# Altium footprint library 20210518.PcbLib: 414 footprints (part 20 of 26)
Each footprint in its own frame and in the unit in brackets; x right, y up, seen from the top. Pads: shape width x height; smd on the part's side, far side on the other; paste and mask are expansions set on the pad; w line width, h text height; cw(c..) or ccw(c..) is an arc to the next point about the centre after c.
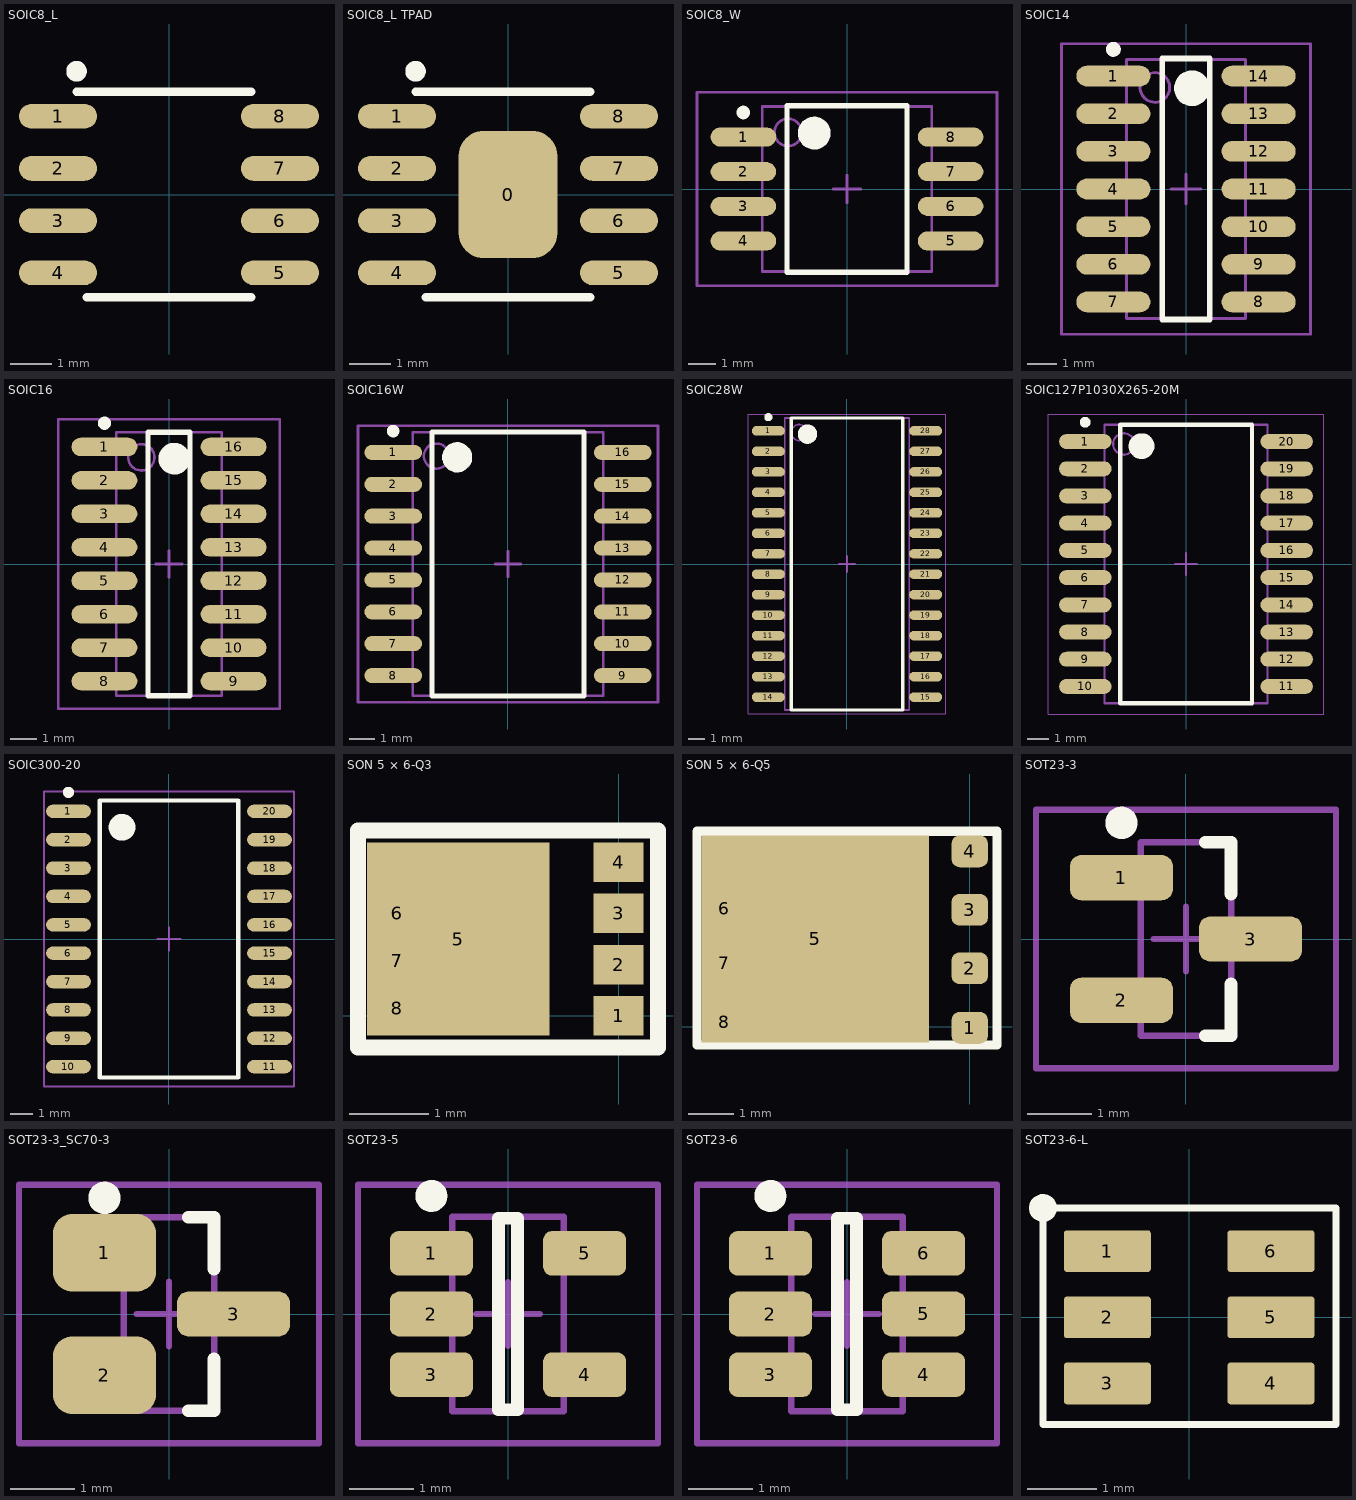
[diagram p19: the footprints below, top view; thin cyan lines are the x and y axes]

## SOIC8_L [mm] "SOIC, 8-Leads, Body 4.9x3.9mm, Pitch 1.27mm, IPC High Density"
height 1.75
pads (8):
  oval 1.9x0.6 smd: 1(-2.7,1.905) 2(-2.7,0.635) 3(-2.7,-0.635) 4(-2.7,-1.905) 5(2.7,-1.905) 6(2.7,-0.635) 7(2.7,0.635) 8(2.7,1.905)
Top Overlay:
  circle w0.25: c-2.25,3 r0.125
  lines w0.2: -2.25,2.5 2,2.5 ; -2,-2.5 2,-2.5
3D body: height 1.75, standoff 0, extent -3.006,-2.5 3.006,2.5

## SOIC8_L TPAD [mm] "SOIC, 8-Leads, Body 4.9x3.9mm, Pitch 1.27mm, IPC High Density"
height 1.75
pads (9):
  rrect50% 2.4x3.1 smd: 0(0,0)
  oval 1.9x0.6 smd: 1(-2.7,1.905) 2(-2.7,0.635) 3(-2.7,-0.635) 4(-2.7,-1.905) 5(2.7,-1.905) 6(2.7,-0.635) 7(2.7,0.635) 8(2.7,1.905)
Top Overlay:
  circle w0.25: c-2.25,3 r0.125
  lines w0.2: -2.25,2.5 2,2.5 ; -2,-2.5 2,-2.5
3D body: height 1.75, standoff 0, extent -3.006,-2.5 3.006,2.5

## SOIC8_W [mm] "SOIC, 8-Leads, Body 6,1x6,2mm (max), Pitch 1,27mm, IPC Low Density"
height 2.5
pads (8):
  oval 2.4x0.7 smd: 1(-3.8,1.905) 2(-3.8,0.635) 3(-3.8,-0.635) 4(-3.8,-1.905) 5(3.8,-1.905) 6(3.8,-0.635) 7(3.8,0.635) 8(3.8,1.905)
Top Overlay:
  circle w0.6: c-1.2,2.05 r0.3
  circle w0.25: c-3.8,2.805 r0.125
  lines w0.2: -2.2,-3.05 2.2,-3.05 2.2,3.05 -2.2,3.05 -2.2,-3.05
Mechanical 13:
  circle w0.1: c-2.16,2.075 r0.5
  lines w0.1: -3.11,-3.025 3.11,-3.025 3.11,3.025 -3.11,3.025 -3.11,-3.025
Mechanical 15:
  lines w0.1: -0.5,0 0.5,0 ; 0,-0.5 0,0.5 ; -5.5,-3.55 5.5,-3.55 5.5,3.55 -5.5,3.55 -5.5,-3.55
3D body: height 1.75, standoff 0, extent -3,-2.45 3,2.45

## SOIC14 [mm] "SOIC, 14-Leads, Body 8,8x4,0mm (max), Pitch 1,27mm, IPC Low Density"
height 1.75
pads (14):
  oval 2.5x0.7 smd: 1(-2.45,3.81) 2(-2.45,2.54) 3(-2.45,1.27) 4(-2.45,0) 5(-2.45,-1.27) 6(-2.45,-2.54) 7(-2.45,-3.81) 8(2.45,-3.81) 9(2.45,-2.54) 10(2.45,-1.27) 11(2.45,0) 12(2.45,1.27) 13(2.45,2.54) 14(2.45,3.81)
Top Overlay:
  circle w0.6: c0.2,3.4 r0.3
  circle w0.25: c-2.45,4.71 r0.125
  lines w0.2: -0.8,-4.4 0.8,-4.4 0.8,4.4 -0.8,4.4 -0.8,-4.4
Mechanical 13:
  circle w0.1: c-1.05,3.425 r0.5
  lines w0.1: -2,-4.375 2,-4.375 2,4.375 -2,4.375 -2,-4.375
Mechanical 15:
  lines w0.1: -0.5,0 0.5,0 ; 0,-0.5 0,0.5 ; -4.2,-4.9 4.2,-4.9 4.2,4.9 -4.2,4.9 -4.2,-4.9
3D body: height 1.75, standoff 0, extent -2.8,-4.23 3,4.3

## SOIC16 [mm] "SOIC, 16-Leads, Body 10,0x4,0mm (max), Pitch 1,27mm, IPC Low Density"
height 1.75
pads (16):
  oval 2.5x0.7 smd: 1(-2.45,4.445) 2(-2.45,3.175) 3(-2.45,1.905) 4(-2.45,0.635) 5(-2.45,-0.635) 6(-2.45,-1.905) 7(-2.45,-3.175) 8(-2.45,-4.445) 9(2.45,-4.445) 10(2.45,-3.175) 11(2.45,-1.905) 12(2.45,-0.635) 13(2.45,0.635) 14(2.45,1.905) 15(2.45,3.175) 16(2.45,4.445)
Top Overlay:
  circle w0.25: c-2.45,5.345 r0.125
  circle w0.6: c0.2,4 r0.3
  lines w0.2: -0.8,-5 -0.8,5 0.8,5 0.8,-5 -0.8,-5
Mechanical 13:
  circle w0.1: c-1.05,4.05 r0.5
  lines w0.1: -2,-5 -2,5 2,5 2,-5 -2,-5
Mechanical 15:
  lines w0.1: -0.5,0 0.5,0 ; 0,-0.5 0,0.5 ; -4.2,-5.5 -4.2,5.5 4.2,5.5 4.2,-5.5 -4.2,-5.5
3D body: height 1.4, standoff 0, extent -3,-4.95 3,4.95

## SOIC16W [mm] "SOIC, 16-Leads, Body 10.5x7.6mm (max), Pitch 1.27mm, IPC Medium Density"
height 2.65
pads (16):
  oval 2.3x0.6 smd: 1(-4.575,4.445) 2(-4.575,3.175) 3(-4.575,1.905) 4(-4.575,0.635) 5(-4.575,-0.635) 6(-4.575,-1.905) 7(-4.575,-3.175) 8(-4.575,-4.445) 9(4.575,-4.445) 10(4.575,-3.175) 11(4.575,-1.905) 12(4.575,-0.635) 13(4.575,0.635) 14(4.575,1.905) 15(4.575,3.175) 16(4.575,4.445)
Top Overlay:
  circle w0.6: c-2.025,4.25 r0.3
  circle w0.25: c-4.575,5.295 r0.125
  lines w0.2: -3.025,-5.25 3.025,-5.25 3.025,5.25 -3.025,5.25 -3.025,-5.25
Mechanical 13:
  circle w0.1: c-2.85,4.3 r0.5
  lines w0.1: -3.8,-5.25 3.8,-5.25 3.8,5.25 -3.8,5.25 -3.8,-5.25
Mechanical 15:
  lines w0.1: -0.5,0 0.5,0 ; 0,-0.5 0,0.5 ; -5.975,-5.5 5.975,-5.5 5.975,5.5 -5.975,5.5 -5.975,-5.5
3D body: height 2.65, standoff 0, extent -5.1,-5.15 5.2,5.15

## SOIC28W [mm] "SOIC, 28-Leads, Body 17.90x7.55mm, Pitch 1.27mm, IPC Medium Density"
height 2.35
pads (28):
  oval 2.05x0.6 smd: 1(-4.875,8.255) 2(-4.875,6.985) 3(-4.875,5.715) 4(-4.875,4.445) 5(-4.875,3.175) 6(-4.875,1.905) 7(-4.875,0.635) 8(-4.875,-0.635) 9(-4.875,-1.905) 10(-4.875,-3.175) 11(-4.875,-4.445) 12(-4.875,-5.715) 13(-4.875,-6.985) 14(-4.875,-8.255) 15(4.875,-8.255) 16(4.875,-6.985) 17(4.875,-5.715) 18(4.875,-4.445) 19(4.875,-3.175) 20(4.875,-1.905) 21(4.875,-0.635) 22(4.875,0.635) 23(4.875,1.905) 24(4.875,3.175) 25(4.875,4.445) 26(4.875,5.715) 27(4.875,6.985) 28(4.875,8.255)
Top Overlay:
  circle w0.6: c-2.45,8.05 r0.3
  circle w0.25: c-4.875,9.105 r0.125
  lines w0.2: -3.45,-9.05 3.45,-9.05 3.45,9.05 -3.45,9.05 -3.45,-9.05
Mechanical 13:
  circle w0.1: c-2.95,8.15 r0.5
  lines w0.1: -3.85,-9.05 3.85,-9.05 3.85,9.05 -3.85,9.05 -3.85,-9.05
Mechanical 15:
  lines w0.05: -6.125,-9.3 6.125,-9.3 6.125,9.3 -6.125,9.3 -6.125,-9.3
  lines w0.1: -0.5,0 0.5,0 ; 0,-0.5 0,0.5
3D body: height 2.35, standoff 0.1, extent -3.85,-9.05 3.85,9.05

## SOIC127P1030X265-20M [mm] "SOIC, 20-Leads, Body 12,80x7,50mm, Pitch 1,27mm, IPC Low Density"
height 2.65
pads (20):
  oval 2.45x0.7 smd: 1(-4.7,5.715) 2(-4.7,4.445) 3(-4.7,3.175) 4(-4.7,1.905) 5(-4.7,0.635) 6(-4.7,-0.635) 7(-4.7,-1.905) 8(-4.7,-3.175) 9(-4.7,-4.445) 10(-4.7,-5.715) 11(4.7,-5.715) 12(4.7,-4.445) 13(4.7,-3.175) 14(4.7,-1.905) 15(4.7,-0.635) 16(4.7,0.635) 17(4.7,1.905) 18(4.7,3.175) 19(4.7,4.445) 20(4.7,5.715)
Top Overlay:
  circle w0.6: c-2.075,5.5 r0.3
  circle w0.25: c-4.7,6.615 r0.125
  lines w0.2: -3.075,-6.5 3.075,-6.5 3.075,6.5 -3.075,6.5 -3.075,-6.5
Mechanical 13:
  circle w0.1: c-2.9,5.6 r0.5
  lines w0.1: -3.8,-6.5 3.8,-6.5 3.8,6.5 -3.8,6.5 -3.8,-6.5
Mechanical 15:
  lines w0.05: -6.425,-7 6.425,-7 6.425,7 -6.425,7 -6.425,-7
  lines w0.1: -0.5,0 0.5,0 ; 0,-0.5 0,0.5
3D body: height 2.6, standoff 0, extent -5.1,-6.3 5.3,6.3

## SOIC300-20 [mm] "20-Pin Plastic Wide Body Small Outline Integrated Circuit 1.27 mm Pitch, IPC High Density"
height 2.65
pads (20):
  oval 2x0.6 smd: 1(-4.5,5.715) 2(-4.5,4.445) 3(-4.5,3.175) 4(-4.5,1.905) 5(-4.5,0.635) 6(-4.5,-0.635) 7(-4.5,-1.905) 8(-4.5,-3.175) 9(-4.5,-4.445) 10(-4.5,-5.715) 11(4.5,-5.715) 12(4.5,-4.445) 13(4.5,-3.175) 14(4.5,-1.905) 15(4.5,-0.635) 16(4.5,0.635) 17(4.5,1.905) 18(4.5,3.175) 19(4.5,4.445) 20(4.5,5.715)
Top Overlay:
  circle w0.25: c-4.5,6.565 r0.125
  circle w0.6: c-2.1,5 r0.3
  lines w0.2: -3.1,-6.2 -3.1,6.2 3.1,6.2 3.1,-6.2 -3.1,-6.2
Mechanical 15:
  lines w0.1: -0.5,0 0.5,0 ; 0,-0.5 0,0.5 ; -5.6,-6.6 -5.6,6.6 5.6,6.6 5.6,-6.6 -5.6,-6.6
3D body: height 1.7, standoff 0, extent -5.321,-6.223 5.322,6.223

## SON 5 × 6-Q3 [mm] "SON 5 × 6-Q3"
height 0.9
pads (8):
  rect 0.63x0.5 smd: 1(0,0) 2(0,0.65) 3(0,1.3) 4(0,1.95) 6(-2.8,1.3) 7(-2.8,0.7) 8(-2.8,0.1)
  rect 2.31x2.45 smd: 5(-2.03,0.975)
Top Overlay:
  lines w0.2: 0.5,2.3 0.5,-0.4 -3.3,-0.4 -3.3,2.35 0.5,2.35

## SON 5 × 6-Q5 [mm] "SON 5 × 6-Q5"
height 0.9
pads (8):
  rrect50% 0.8x0.7 smd: 1(0,-0.025) 2(0,1.286) 3(0,2.573) 4(0,3.858)
  rect 5x4.56 smd: 5(-3.4,1.93)
  rect 0.63x0.5 smd: 6(-5.4,2.6) 7(-5.4,1.4) 8(-5.4,0.1)
Top Overlay:
  lines w0.2: -6,-0.4 0.6,-0.4 0.6,4.3 -6,4.3 -6,-0.4

## SOT23-3 [mm] "SOT23, 3-Leads, Body 3,0x2,5mm (max), Pitch 0,95mm, IPC Low Density"
height 1.1
pads (3):
  rrect50% 1.6x0.7 smd: 1(-1,0.95) 2(-1,-0.95) 3(1,0)
Top Overlay:
  circle w0.25: c-1,1.8 r0.125
  lines w0.2: 0.3,-1.5 0.7,-1.5 0.7,-0.7 ; 0.3,1.5 0.7,1.5 0.7,0.7
Mechanical 13:
  lines w0.1: -0.7,-1.5 -0.7,1.5 0.7,1.5 0.7,-1.5 -0.7,-1.5
Mechanical 15:
  lines w0.1: -0.5,0 0.5,0 ; 0,-0.5 0,0.5 ; -2.325,-2 -2.325,2 2.325,2 2.325,-2 -2.325,-2
3D body: height 1, standoff -0.02, extent -1.25,-1.46 1.226,1.46

## SOT23-3_SC70-3 [mm] "SOT23, 3-Leads, Body 3,0x2,5mm (max), Pitch 0,95mm, IPC Low Density"
height 1.1
pads (3):
  rrect50% 1.6x1.2 smd: 1(-1,0.95) 2(-1,-0.95)
  rrect50% 1.75x0.7 smd: 3(1,0)
Top Overlay:
  circle w0.25: c-1,1.8 r0.125
  lines w0.2: 0.3,-1.5 0.7,-1.5 0.7,-0.7 ; 0.3,1.5 0.7,1.5 0.7,0.7
Mechanical 13:
  lines w0.1: -0.7,-1.5 0.7,-1.5 0.7,1.5 -0.7,1.5 -0.7,-1.5
Mechanical 15:
  lines w0.1: -0.5,0 0.5,0 ; 0,-0.5 0,0.5 ; -2.325,-2 2.325,-2 2.325,2 -2.325,2 -2.325,-2
3D body: height 1, standoff -0.02, extent -1.25,-1.46 1.226,1.46

## SOT23-5 [mm] "SOT23, 5-Leads, Body 3,0x3,0mm (max), Pitch 0,95mm, IPC Low Density"
height 1.45
pads (5):
  rrect40% 1.3x0.7 smd: 1(-1.2,0.95) 2(-1.2,0) 3(-1.2,-0.95) 4(1.2,-0.95) 5(1.2,0.95)
Top Overlay:
  circle w0.25: c-1.2,1.85 r0.125
  lines w0.2: -0.15,-1.5 0.15,-1.5 0.15,1.5 -0.15,1.5 -0.15,-1.5
Mechanical 13:
  lines w0.1: -0.875,-1.525 -0.875,1.525 0.875,1.525 0.875,-1.525 -0.875,-1.525
Mechanical 15:
  lines w0.1: -0.5,0 0.5,0 ; 0,-0.5 0,0.5 ; -2.35,-2.025 -2.35,2.025 2.35,2.025 2.35,-2.025 -2.35,-2.025
3D body: height 1, standoff 0, extent -1.17,-1.46 1.17,1.46

## SOT23-6 [mm] "SOT23, 6-Leads, Body 3,0x3,0mm (max), Pitch 0,95mm, IPC Low Density"
height 1.45
pads (6):
  rrect40% 1.3x0.7 smd: 1(-1.2,0.95) 2(-1.2,0) 3(-1.2,-0.95) 4(1.2,-0.95) 5(1.2,0) 6(1.2,0.95)
Top Overlay:
  circle w0.25: c-1.2,1.85 r0.125
  lines w0.2: -0.15,-1.5 0.15,-1.5 0.15,1.5 -0.15,1.5 -0.15,-1.5
Mechanical 13:
  lines w0.1: -0.875,-1.525 -0.875,1.525 0.875,1.525 0.875,-1.525 -0.875,-1.525
Mechanical 15:
  lines w0.1: -0.5,0 0.5,0 ; 0,-0.5 0,0.5 ; -2.35,-2.025 -2.35,2.025 2.35,2.025 2.35,-2.025 -2.35,-2.025
3D body: height 1.1, standoff -0.01, extent -1.422,-1.461 1.422,1.46

## SOT23-6-L [mm]
pads (6):
  rrect15% 1.25x0.6 smd: 1(-1.175,0.95) 2(-1.175,0) 3(-1.175,-0.95) 4(1.175,-0.95) 5(1.175,0) 6(1.175,0.95)
Top Overlay:
  circle w0.2: c-2.1,1.57 r0.1
  lines w0.1: -2.1,-1.54 2.11,-1.54 2.11,1.57 -2.1,1.57 -2.1,-1.54
3D body: height 1.18, standoff 0, extent -1.397,-1.448 1.403,1.448